# Altium footprint library 集大电协1.5.PcbLib: 227 footprints (part 9 of 18) (continued)
## LOGO_Wheel [mm] (continued)
0.277,-1.76 ; 0.241,0.267 0.419,0.267 ; 0.277,-0.409 0.472,-0.409 ; 0.295,-0.231 0.437,-0.231 ; 0.312,0.427 0.49,0.427 ; 0.312,1.316 0.668,1.316 ; 0.33,-1.689 0.721,-1.689 ; 0.33,-0.213 0.455,-0.213 ; 0.33,0.249 0.437,0.249 ; 0.348,-0.605 0.419,-0.605 ; 0.348,-0.587 0.419,-0.587 ; 0.348,-0.569 0.472,-0.569 ; 0.348,-0.551 0.508,-0.551 ; 0.348,-0.533 0.597,-0.533 ; 0.348,-0.391 0.508,-0.391 ; 0.348,0.231 0.455,0.231 ; 0.366,-1.049 0.437,-1.049 ; 0.366,-1.031 0.437,-1.031 ; 0.366,-1.013 0.437,-1.013 ; 0.366,-0.996 0.437,-0.996 ; 0.366,-0.978 0.437,-0.978 ; 0.366,-0.96 0.437,-0.96 ; 0.366,-0.942 0.437,-0.942 ; 0.366,-0.925 0.437,-0.925 ; 0.366,-0.907 0.437,-0.907 ; 0.366,-0.889 0.437,-0.889 ; 0.366,-0.871 0.437,-0.871 ; 0.366,-0.853 0.437,-0.853 ; 0.366,-0.836 0.437,-0.836 ; 0.366,-0.818 0.437,-0.818 ; 0.366,-0.8 0.437,-0.8 ; 0.366,-0.782 0.437,-0.782 ; 0.366,-0.765 0.437,-0.765 ; 0.366,-0.747 0.437,-0.747 ; 0.366,-0.729 0.437,-0.729 ; 0.366,-0.711 0.437,-0.711 ; 0.366,-0.693 0.437,-0.693 ; 0.366,-0.676 0.419,-0.676 ; 0.366,-0.658 0.419,-0.658 ; 0.366,-0.64 0.419,-0.64 ; 0.366,-0.622 0.419,-0.622 ; 0.366,-0.196 0.472,-0.196 ; 0.366,0.409 0.508,0.409 ; 0.366,0.551 0.597,0.551 ; 0.366,0.569 0.615,0.569 ; 0.366,0.587 0.49,0.587 ; 0.366,0.605 0.437,0.605 ; 0.366,0.622 0.437,0.622 ; 0.366,0.64 0.437,0.64 ; 0.366,0.658 0.437,0.658 ; 0.366,0.676 0.437,0.676 ; 0.366,0.693 0.437,0.693 ; 0.366,0.711 0.437,0.711 ; 0.366,0.729 0.437,0.729 ; 0.366,0.747 0.437,0.747 ; 0.366,0.765 0.437,0.765 ; 0.366,0.782 0.437,0.782 ; 0.366,0.8 0.437,0.8 ; 0.366,0.818 0.437,0.818 ; 0.366,0.836 0.437,0.836 ; 0.366,0.853 0.437,0.853 ; 0.366,0.871 0.437,0.871 ; 0.366,0.889 0.437,0.889 ; 0.366,0.907 0.437,0.907 ; 0.366,0.925 0.437,0.925 ; 0.366,0.942 0.437,0.942 ; 0.366,0.96 0.437,0.96 ; 0.366,0.978 0.437,0.978 ; 0.366,0.996 0.437,0.996 ; 0.366,1.013 0.437,1.013 ; 0.366,1.031 0.437,1.031 ; 0.366,1.049 0.437,1.049 ; 0.366,1.067 0.437,1.067 ; 0.366,1.085 0.437,1.085 ; 0.366,1.102 0.437,1.102 ; 0.366,1.12 0.437,1.12 ; 0.366,1.138 0.686,1.138 ; 0.366,1.156 0.632,1.156 ; 0.366,1.173 0.544,1.173 ; 0.366,1.191 0.384,1.191 ; 0.384,-1.156 0.579,-1.156 ; 0.384,-1.138 0.632,-1.138 ; 0.384,-1.12 0.686,-1.12 ; 0.384,-1.102 0.455,-1.102 ; 0.384,-1.085 0.437,-1.085 ; 0.384,-1.067 0.437,-1.067 ; 0.384,-0.178 0.49,-0.178 ; 0.384,0.213 0.472,0.213 ; 0.401,-1.28 0.686,-1.28 ; 0.401,-0.516 0.579,-0.516 ; 0.401,-0.373 0.526,-0.373 ; 0.401,-0.16 0.49,-0.16 ; 0.401,0.196 0.49,0.196 ; 0.401,0.391 0.544,0.391 ; 0.419,-1.173 0.455,-1.173 ; 0.419,-0.142 0.508,-0.142 ; 0.419,0.178 0.49,0.178 ; 0.419,1.707 0.739,1.707 ; 0.437,-0.356 0.544,-0.356 ; 0.437,-0.124 0.508,-0.124 ; 0.437,-0.107 0.526,-0.107 ; 0.437,0.142 0.508,0.142 ; 0.437,0.16 0.508,0.16 ; 0.437,0.373 0.561,0.373 ; 0.437,0.533 0.579,0.533 ; 0.455,-0.498 0.561,-0.498 ; 0.455,-0.338 0.561,-0.338 ; 0.455,-0.089 0.526,-0.089 ; 0.455,-0.071 0.526,-0.071 ; 0.455,0.089 0.526,0.089 ; 0.455,0.107 0.526,0.107 ; 0.455,0.124 0.526,0.124 ; 0.455,1.12 0.739,1.12 ; 0.472,-1.102 0.721,-1.102 ; 0.472,-0.32 0.579,-0.32 ; 0.472,-0.053 0.544,-0.053 ; 0.472,-0.036 0.544,-0.036 ; 0.472,-0.018 0.544,-0.018 ; 0.472,0 0.544,0 ; 0.472,0.018 0.544,0.018 ; 0.472,0.036 0.544,0.036 ; 0.472,0.053 0.544,0.053 ; 0.472,0.071 0.544,0.071 ; 0.472,0.356 0.579,0.356 ; 0.472,0.516 0.561,0.516 ; 0.472,1.298 0.721,1.298 ; 0.49,-1.671 0.775,-1.671 ; 0.49,-0.48 0.544,-0.48 ; 0.49,0.338 0.597,0.338 ; 0.49,0.498 0.544,0.498 ; 0.508,-1.262 0.739,-1.262 ; 0.508,-0.462 0.526,-0.462 ; 0.508,-0.302 0.597,-0.302 ; 0.508,0.32 0.597,0.32 ; 0.508,0.48 0.526,0.48 ; 0.526,-0.551 0.615,-0.551 ; 0.526,-0.284 0.615,-0.284 ; 0.526,0.302 0.615,0.302 ; 0.526,1.689 0.792,1.689 ; 0.544,-0.569 0.632,-0.569 ; 0.544,-0.267 0.632,-0.267 ; 0.544,0.284 0.632,0.284 ; 0.544,0.587 0.632,0.587 ; 0.544,1.28 0.757,1.28 ; 0.561,-0.587 0.65,-0.587 ; 0.561,-0.249 0.632,-0.249 ; 0.561,-0.231 0.65,-0.231 ; 0.561,0.267 0.632,0.267 ; 0.561,0.605 0.65,0.605 ; 0.561,1.102 0.775,1.102 ; 0.579,-1.654 0.828,-1.654 ; 0.579,-1.245 0.775,-1.245 ; 0.579,-1.085 0.757,-1.085 ; 0.579,-0.605 0.686,-0.605 ; 0.579,-0.213 0.65,-0.213 ; 0.579,-0.196 0.668,-0.196 ; 0.579,0.231 0.668,0.231 ; 0.579,0.249 0.65,0.249 ; 0.579,0.622 0.668,0.622 ; 0.597,-0.622 0.704,-0.622 ; 0.597,-0.178 0.668,-0.178 ; 0.597,-0.16 0.686,-0.16 ; 0.597,0.196 0.668,0.196 ; 0.597,0.213 0.668,0.213 ; 0.597,0.64 0.686,0.64 ; 0.615,-0.64 0.721,-0.64 ; 0.615,-0.142 0.686,-0.142 ; 0.615,-0.124 0.686,-0.124 ; 0.615,0.142 0.686,0.142 ; 0.615,0.16 0.686,0.16 ; 0.615,0.178 0.686,0.178 ; 0.615,0.658 0.704,0.658 ; 0.615,1.262 0.792,1.262 ; 0.615,1.671 0.846,1.671 ; 0.632,-1.227 0.828,-1.227 ; 0.632,-1.067 0.775,-1.067 ; 0.632,-0.658 0.739,-0.658 ; 0.632,-0.107 0.704,-0.107 ; 0.632,-0.089 0.704,-0.089 ; 0.632,-0.071 0.704,-0.071 ; 0.632,-0.053 0.704,-0.053 ; 0.632,-0.036 0.704,-0.036 ; 0.632,0.053 0.704,0.053 ; 0.632,0.071 0.704,0.071 ; 0.632,0.089 0.704,0.089 ; 0.632,0.107 0.704,0.107 ; 0.632,0.124 0.704,0.124 ; 0.632,0.676 0.721,0.676 ; 0.65,-1.636 0.864,-1.636 ; 0.65,-0.676 0.757,-0.676 ; 0.65,-0.018 0.704,-0.018 ; 0.65,0 0.704,0 ; 0.65,0.018 0.704,0.018 ; 0.65,0.036 0.704,0.036 ; 0.65,0.693 0.739,0.693 ; 0.65,1.085 0.81,1.085 ; 0.668,-1.049 0.81,-1.049 ; 0.668,-0.693 0.775,-0.693 ; 0.668,0.711 0.757,0.711 ; 0.668,1.245 0.828,1.245 ; 0.686,-1.209 0.864,-1.209 ; 0.686,-0.711 0.792,-0.711 ; 0.686,-0.284 0.792,-0.284 ; 0.686,-0.267 0.792,-0.267 ; 0.686,0.729 0.775,0.729 ; 0.686,1.067 0.828,1.067 ; 0.686,1.654 0.899,1.654 ; 0.704,-1.031 0.828,-1.031 ; 0.704,-0.729 0.81,-0.729 ; 0.704,-0.249 0.792,-0.249 ; 0.704,0.284 0.792,0.284 ; 0.704,0.302 0.792,0.302 ; 0.704,0.32 0.81,0.32 ; 0.704,0.747 0.792,0.747 ; 0.704,1.227 0.881,1.227 ; 0.721,-1.618 0.917,-1.618 ; 0.721,-0.747 0.828,-0.747 ; 0.721,-0.302 0.81,-0.302 ; 0.721,-0.231 0.81,-0.231 ; 0.721,0.249 0.81,0.249 ; 0.721,0.267 0.792,0.267 ; 0.721,0.338 0.828,0.338 ; 0.721,0.765 0.81,0.765 ; 0.739,-1.191 0.881,-1.191 ; 0.739,-1.013 0.864,-1.013 ; 0.739,-0.32 0.828,-0.32 ; 0.739,-0.213 0.81,-0.213 ; 0.739,-0.196 0.81,-0.196 ; 0.739,0.213 0.81,0.213 ; 0.739,0.231 0.81,0.231 ; 0.739,0.356 0.846,0.356 ; 0.739,0.782 0.828,0.782 ; 0.739,1.049 0.864,1.049 ; 0.739,1.636 0.935,1.636 ; 0.757,-0.996 0.881,-0.996 ; 0.757,-0.765 0.846,-0.765 ; 0.757,-0.338 0.846,-0.338 ; 0.757,-0.178 1.237,-0.178 ; 0.757,-0.16 1.397,-0.16 ; 0.757,-0.142 1.397,-0.142 ; 0.757,-0.124 1.397,-0.124 ; 0.757,0.142 1.006,0.142 ; 0.757,0.16 1.415,0.16 ; 0.757,0.178 1.415,0.178 ; 0.757,0.196 1.415,0.196 ; 0.757,0.373 0.864,0.373 ; 0.757,0.8 0.846,0.8 ; 0.757,1.209 0.899,1.209 ; 0.775,-1.6 0.953,-1.6 ; 0.775,-1.173 0.917,-1.173 ; 0.775,-0.782 0.864,-0.782 ; 0.775,-0.356 0.864,-0.356 ; 0.775,0.391 0.881,0.391 ; 0.775,0.818 0.864,0.818 ; 0.775,1.031 0.881,1.031 ; 0.792,-0.978 0.899,-0.978 ; 0.792,-0.8 0.881,-0.8 ; 0.792,-0.373 0.881,-0.373 ; 0.792,0.409 0.899,0.409 ; 0.792,0.836 0.881,0.836 ; 0.792,1.013 0.899,1.013 ; 0.792,1.191 0.935,1.191 ; 0.792,1.618 0.97,1.618 ; 0.81,-1.156 0.953,-1.156 ; 0.81,-0.96 0.917,-0.96 ; 0.81,-0.818 0.917,-0.818 ; 0.81,-0.391 0.899,-0.391 ; 0.81,0.427 0.917,0.427 ; 0.81,0.853 0.899,0.853 ; 0.828,-1.582 0.988,-1.582 ; 0.828,-0.942 0.935,-0.942 ; 0.828,-0.836 0.935,-0.836 ; 0.828,-0.409 0.917,-0.409 ; 0.828,0.445 0.935,0.445 ; 0.828,0.871 0.917,0.871 ; 0.828,0.996 0.935,0.996 ; 0.828,1.173 0.953,1.173 ; 0.846,-1.138 0.97,-1.138 ; 0.846,-0.925 0.953,-0.925 ; 0.846,-0.853 0.953,-0.853 ; 0.846,-0.427 0.935,-0.427 ; 0.846,0.462 0.935,0.462 ; 0.846,0.889 0.935,0.889 ; 0.846,0.978 0.935,0.978 ; 0.846,1.156 0.988,1.156 ; 0.846,1.6 1.006,1.6 ; 0.864,-1.565 1.024,-1.565 ; 0.864,-1.12 1.006,-1.12 ; 0.864,-0.871 0.97,-0.871 ; 0.864,-0.445 0.97,-0.445 ; 0.864,0.48 0.953,0.48 ; 0.864,0.907 0.953,0.907 ; 0.864,0.96 0.953,0.96 ; 0.881,-0.907 0.97,-0.907 ; 0.881,-0.889 0.988,-0.889 ; 0.881,-0.462 0.988,-0.462 ; 0.881,0.498 0.97,0.498 ; 0.881,0.925 0.97,0.925 ; 0.881,0.942 0.97,0.942 ; 0.881,1.138 1.006,1.138 ; 0.881,1.582 1.041,1.582 ; 0.899,-1.547 1.059,-1.547 ; 0.899,-1.102 1.024,-1.102 ; 0.899,-0.48 1.006,-0.48 ; 0.899,0.516 0.988,0.516 ; 0.917,-0.498 1.024,-0.498 ; 0.917,0.533 1.006,0.533 ; 0.917,1.12 1.041,1.12 ; 0.917,1.565 1.077,1.565 ; 0.935,-1.529 1.095,-1.529 ; 0.935,-1.085 1.059,-1.085 ; 0.935,-0.516 1.041,-0.516 ; 0.935,0.551 1.024,0.551 ; 0.953,-1.067 1.077,-1.067 ; 0.953,-0.533 1.059,-0.533 ; 0.953,0.569 1.041,0.569 ; 0.953,1.102 1.059,1.102 ; 0.97,-0.551 1.077,-0.551 ; 0.97,0.587 1.059,0.587 ; 0.97,1.085 1.077,1.085 ; 0.97,1.547 1.113,1.547 ; 0.988,-1.511 1.13,-1.511 ; 0.988,-1.049 1.095,-1.049 ; 0.988,-0.569 1.095,-0.569 ; 0.988,0.605 1.077,0.605 ; 0.988,1.067 1.113,1.067 ; 1.006,-1.031 1.113,-1.031 ; 1.006,-0.587 1.113,-0.587 ; 1.006,0.622 1.095,0.622 ; 1.006,1.529 1.13,1.529 ; 1.024,-1.494 1.148,-1.494 ; 1.024,-1.013 1.148,-1.013 ; 1.024,-0.605 1.13,-0.605 ; 1.024,0.64 1.113,0.64 ; 1.024,1.049 1.13,1.049 ; 1.041,-1.476 1.184,-1.476 ; 1.041,-0.622 1.148,-0.622 ; 1.041,0.658 1.13,0.658 ; 1.041,1.031 1.148,1.031 ; 1.041,1.511 1.166,1.511 ; 1.059,-0.996 1.166,-0.996 ; 1.059,-0.64 1.255,-0.64 ; 1.059,0.213 1.415,0.213 ; 1.059,0.676 1.219,0.676 ; 1.059,0.693 1.201,0.693 ; 1.059,1.013 1.166,1.013 ; 1.059,1.494 1.201,1.494 ; 1.077,-1.458 1.201,-1.458 ; 1.077,-0.978 1.184,-0.978 ; 1.077,-0.658 1.237,-0.658 ; 1.077,0.711 1.184,0.711 ; 1.077,0.996 1.184,0.996 ; 1.095,-0.96 1.201,-0.96 ; 1.095,-0.676 1.219,-0.676 ; 1.095,0.729 1.166,0.729 ; 1.095,0.978 1.201,0.978 ; 1.095,1.476 1.219,1.476 ; 1.113,-1.44 1.237,-1.44 ; 1.113,-0.942 1.201,-0.942 ; 1.113,0.747 1.166,0.747 ; 1.13,-1.422 1.255,-1.422 ; 1.13,-0.925 1.219,-0.925 ; 1.13,-0.693 1.201,-0.693 ; 1.13,0.96 1.219,0.96 ; 1.13,1.458 1.255,1.458 ; 1.148,-0.907 1.237,-0.907 ; 1.148,-0.711 1.184,-0.711 ; 1.148,0.658 1.237,0.658 ; 1.148,0.942 1.237,0.942 ; 1.148,1.44 1.273,1.44 ; 1.166,-1.405 1.29,-1.405 ; 1.166,-0.889 1.255,-0.889 ; 1.166,-0.622 1.255,-0.622 ; 1.166,0.64 1.255,0.64 ; 1.166,0.907 1.273,0.907 ; 1.166,0.925 1.255,0.925 ; 1.184,-1.387 1.308,-1.387 ; 1.184,-0.871 1.273,-0.871 ; 1.184,-0.605 1.273,-0.605 ; 1.184,0.605 1.273,0.605 ; 1.184,0.622 1.255,0.622 ; 1.184,0.889 1.29,0.889 ; 1.184,1.422 1.29,1.422 ; 1.201,-0.853 1.29,-0.853 ; 1.201,-0.587 1.29,-0.587 ; 1.201,0.587 1.29,0.587 ; 1.201,0.871 1.29,0.871 ; 1.201,1.405 1.326,1.405 ; 1.219,-1.369 1.326,-1.369 ; 1.219,-0.836 1.308,-0.836 ; 1.219,-0.569 1.29,-0.569 ; 1.219,-0.551 1.308,-0.551 ; 1.219,0.569 1.29,0.569 ; 1.219,0.853 1.308,0.853 ; 1.237,-1.351 1.344,-1.351 ; 1.237,-0.818 1.308,-0.818 ; 1.237,-0.8 1.326,-0.8 ; 1.237,-0.533 1.326,-0.533 ; 1.237,0.533 1.326,0.533 ; 1.237,0.551 1.308,0.551 ; 1.237,0.836 1.326,0.836 ; 1.237,1.387 1.344,1.387 ; 1.255,-1.333 1.379,-1.333 ; 1.255,-0.782 1.344,-0.782 ; 1.255,-0.516 1.326,-0.516 ; 1.255,-0.498 1.326,-0.498 ; 1.255,0.498 1.344,0.498 ; 1.255,0.516 1.326,0.516 ; 1.255,0.8 1.344,0.8 ; 1.255,0.818 1.344,0.818 ; 1.255,1.369 1.361,1.369 ; 1.273,-0.765 1.361,-0.765 ; 1.273,-0.48 1.344,-0.48 ; 1.273,-0.462 1.344,-0.462 ; 1.273,-0.445 1.361,-0.445 ; 1.273,-0.107 1.397,-0.107 ; 1.273,0.462 1.361,0.462 ; 1.273,0.48 1.344,0.48 ; 1.273,0.782 1.361,0.782 ; 1.273,1.351 1.379,1.351 ; 1.29,-1.316 1.397,-1.316 ; 1.29,-0.747 1.361,-0.747 ; 1.29,-0.729 1.379,-0.729 ; 1.29,-0.427 1.361,-0.427 ; 1.29,-0.409 1.361,-0.409 ; 1.29,-0.391 1.361,-0.391 ; 1.29,0.427 1.379,0.427 ; 1.29,0.445 1.361,0.445 ; 1.29,0.765 1.379,0.765 ; 1.29,1.333 1.397,1.333 ; 1.308,-1.298 1.415,-1.298 ; 1.308,-0.711 1.397,-0.711 ; 1.308,-0.373 1.379,-0.373 ; 1.308,-0.356 1.379,-0.356 ; 1.308,-0.338 1.379,-0.338 ; 1.308,-0.32 1.379,-0.32 ; 1.308,0.391 1.379,0.391 ; 1.308,0.409 1.379,0.409 ; 1.308,0.729 1.397,0.729 ; 1.308,0.747 1.379,0.747 ; 1.308,1.316 1.415,1.316 ; 1.326,-1.28 1.433,-1.28 ; 1.326,-0.693 1.397,-0.693 ; 1.326,-0.676 1.415,-0.676 ; 1.326,-0.302 1.379,-0.302 ; 1.326,-0.284 1.397,-0.284 ; 1.326,-0.267 1.397,-0.267 ; 1.326,-0.249 1.397,-0.249 ; 1.326,-0.231 1.397,-0.231 ; 1.326,-0.213 1.397,-0.213 ; 1.326,-0.196 1.397,-0.196 ; 1.326,-0.178 1.397,-0.178 ; 1.326,0.302 1.397,0.302 ; 1.326,0.32 1.397,0.32 ; 1.326,0.338 1.397,0.338 ; 1.326,0.356 1.397,0.356 ; 1.326,0.373 1.397,0.373 ; 1.326,0.711 1.415,0.711 ; 1.344,-1.262 1.45,-1.262 ; 1.344,-0.658 1.415,-0.658 ; 1.344,-0.64 1.433,-0.64 ; 1.344,0.231 1.415,0.231 ; 1.344,0.249 1.415,0.249 ; 1.344,0.267 1.415,0.267 ; 1.344,0.284 1.397,0.284 ; 1.344,0.676 1.433,0.676 ; 1.344,0.693 1.415,0.693 ; 1.344,1.298 1.433,1.298 ; 1.361,-1.245 1.468,-1.245 ; 1.361,-0.622 1.45,-0.622 ; 1.361,0.64 1.45,0.64 ; 1.361,0.658 1.433,0.658 ; 1.361,1.28 1.45,1.28 ; 1.379,-1.227 1.486,-1.227 ; 1.379,-0.605 1.45,-0.605 ; 1.379,-0.587 1.468,-0.587 ; 1.379,0.605 1.468,0.605 ; 1.379,0.622 1.45,0.622 ; 1.379,1.262 1.486,1.262 ; 1.397,-0.569 1.468,-0.569 ; 1.397,-0.551 1.468,-0.551 ; 1.397,0.569 1.486,0.569 ; 1.397,0.587 1.468,0.587 ; 1.397,1.245 1.486,1.245 ; 1.415,-1.209 1.504,-1.209 ; 1.415,-0.533 1.486,-0.533 ; 1.415,-0.516 1.486,-0.516 ; 1.415,0.533 1.486,0.533 ; 1.415,0.551 1.486,0.551 ; 1.415,1.227 1.504,1.227 ; 1.433,-1.191 1.521,-1.191 ; 1.433,-0.498 1.504,-0.498 ; 1.433,-0.48 1.504,-0.48 ; 1.433,-0.462 1.521,-0.462 ; 1.433,0.48 1.521,0.48 ; 1.433,0.498 1.504,0.498 ; 1.433,0.516 1.504,0.516 ; 1.433,1.209 1.521,1.209 ; 1.45,-1.173 1.539,-1.173 ; 1.45,-1.156 1.557,-1.156 ; 1.45,-0.445 1.521,-0.445 ; 1.45,-0.427 1.521,-0.427 ; 1.45,-0.409 1.539,-0.409 ; 1.45,0.445 1.521,0.445 ; 1.45,0.462 1.521,0.462 ; 1.45,1.191 1.539,1.191 ; 1.468,-1.138 1.575,-1.138 ; 1.468,-0.391 1.539,-0.391 ; 1.468,-0.373 1.539,-0.373 ; 1.468,-0.356 1.539,-0.356 ; 1.468,0.391 1.539,0.391 ; 1.468,0.409 1.539,0.409 ; 1.468,0.427 1.539,0.427 ; 1.468,1.173 1.557,1.173 ; 1.486,-1.12 1.593,-1.12 ; 1.486,-0.338 1.557,-0.338 ; 1.486,-0.32 1.557,-0.32 ; 1.486,-0.302 1.557,-0.302 ; 1.486,-0.284 1.557,-0.284 ; 1.486,0.32 1.557,0.32 ; 1.486,0.338 1.557,0.338 ; 1.486,0.356 1.557,0.356 ; 1.486,0.373 1.539,0.373 ; 1.486,1.156 1.575,1.156 ; 1.504,-1.102 1.593,-1.102 ; 1.504,-0.267 1.575,-0.267 ; 1.504,-0.249 1.575,-0.249 ; 1.504,-0.231 1.575,-0.231 ; 1.504,-0.213 1.575,-0.213 ; 1.504,-0.196 1.575,-0.196 ; 1.504,0.213 1.575,0.213 ; 1.504,0.231 1.575,0.231 ; 1.504,0.249 1.575,0.249 ; 1.504,0.267 1.575,0.267 ; 1.504,0.284 1.575,0.284 ; 1.504,0.302 1.575,0.302 ; 1.504,1.138 1.593,1.138 ; 1.521,-1.085 1.61,-1.085 ; 1.521,-0.178 1.593,-0.178 ; 1.521,-0.16 1.593,-0.16 ; 1.521,-0.142 1.593,-0.142 ; 1.521,-0.124 1.593,-0.124 ; 1.521,-0.107 1.593,-0.107 ; 1.521,-0.089 1.593,-0.089 ; 1.521,-0.071 1.593,-0.071 ; 1.521,-0.053 1.593,-0.053 ; 1.521,-0.036 1.593,-0.036 ; 1.521,-0.018 1.593,-0.018 ; 1.521,0 1.593,0 ; 1.521,0.018 1.593,0.018 ; 1.521,0.036 1.593,0.036 ; 1.521,0.053 1.593,0.053 ; 1.521,0.071 1.593,0.071 ; 1.521,0.089 1.593,0.089 ; 1.521,0.107 1.593,0.107 ; 1.521,0.124 1.593,0.124 ; 1.521,0.142 1.593,0.142 ; 1.521,0.16 1.593,0.16 ; 1.521,0.178 1.593,0.178 ; 1.521,0.196 1.593,0.196 ; 1.521,1.12 1.61,1.12 ; 1.539,-1.067 1.628,-1.067 ; 1.539,1.085 1.628,1.085 ; 1.539,1.102 1.61,1.102 ; 1.557,-1.049 1.646,-1.049 ; 1.557,-1.031 1.646,-1.031 ; 1.557,1.067 1.646,1.067 ; 1.575,-1.013 1.664,-1.013 ; 1.575,1.049 1.664,1.049 ; 1.593,-0.996 1.681,-0.996 ; 1.593,1.013 1.681,1.013 ; 1.593,1.031 1.664,1.031 ; 1.61,-0.978 1.681,-0.978 ; 1.61,-0.96 1.699,-0.96 ; 1.61,0.996 1.699,0.996 ; 1.628,-0.942 1.717,-0.942 ; 1.628,0.978 1.699,0.978 ; 1.646,-0.925 1.717,-0.925 ; 1.646,-0.907 1.735,-0.907 ; 1.646,0.942 1.735,0.942 ; 1.646,0.96 1.717,0.96 ; 1.664,-0.889 1.753,-0.889 ; 1.664,0.907 1.753,0.907 ; 1.664,0.925 1.735,0.925 ; 1.681,-0.871 1.753,-0.871 ; 1.681,-0.853 1.77,-0.853 ; 1.681,0.889 1.77,0.889 ; 1.699,-0.836 1.77,-0.836 ; 1.699,-0.818 1.788,-0.818 ; 1.699,0.853 1.788,0.853 ; 1.699,0.871 1.77,0.871 ; 1.717,-0.8 1.788,-0.8 ; 1.717,0.818 1.806,0.818 ; 1.717,0.836 1.788,0.836 ; 1.735,-0.782 1.806,-0.782 ; 1.735,-0.765 1.806,-0.765 ; 1.735,0.782 1.824,0.782 ; 1.735,0.8 1.806,0.8 ; 1.753,-0.747 1.824,-0.747 ; 1.753,-0.729 1.824,-0.729 ; 1.753,0.747 1.841,0.747 ; 1.753,0.765 1.824,0.765 ; 1.77,-0.711 1.841,-0.711 ; 1.77,-0.693 1.841,-0.693 ; 1.77,0.711 1.841,0.711 ; 1.77,0.729 1.841,0.729 ; 1.788,-0.676 1.859,-0.676 ; 1.788,-0.658 1.859,-0.658 ; 1.788,-0.64 1.859,-0.64 ; 1.788,0.676 1.859,0.676 ; 1.788,0.693 1.859,0.693 ; 1.806,-0.622 1.877,-0.622 ; 1.806,-0.605 1.877,-0.605 ; 1.806,0.622 1.877,0.622 ; 1.806,0.64 1.877,0.64 ; 1.806,0.658 1.877,0.658 ; 1.824,-0.587 1.895,-0.587 ; 1.824,-0.569 1.895,-0.569 ; 1.824,-0.551 1.895,-0.551 ; 1.824,0.569 1.895,0.569 ; 1.824,0.587 1.895,0.587 ; 1.824,0.605 1.895,0.605 ; 1.841,-0.533 1.913,-0.533 ; 1.841,-0.516 1.913,-0.516 ; 1.841,-0.498 1.913,-0.498 ; 1.841,0.516 1.913,0.516 ; 1.841,0.533 1.913,0.533 ; 1.841,0.551 1.913,0.551 ; 1.859,-0.48 1.93,-0.48 ; 1.859,-0.462 1.93,-0.462 ; 1.859,-0.445 1.93,-0.445 ; 1.859,-0.427 1.93,-0.427 ; 1.859,0.462 1.93,0.462 ; 1.859,0.48 1.93,0.48 ; 1.859,0.498 1.93,0.498 ; 1.877,-0.409 1.948,-0.409 ; 1.877,-0.391 1.948,-0.391 ; 1.877,-0.373 1.948,-0.373 ; 1.877,-0.356 1.948,-0.356 ; 1.877,0.391 1.948,0.391 ; 1.877,0.409 1.948,0.409 ; 1.877,0.427 1.948,0.427 ; 1.877,0.445 1.948,0.445 ; 1.895,-0.338 1.966,-0.338 ; 1.895,-0.32 1.966,-0.32 ; 1.895,-0.302 1.966,-0.302 ; 1.895,-0.284 1.966,-0.284 ; 1.895,-0.267 1.966,-0.267 ; 1.895,0.284 1.966,0.284 ; 1.895,0.302 1.966,0.302 ; 1.895,0.32 1.966,0.32 ; 1.895,0.338 1.966,0.338 ; 1.895,0.356 1.966,0.356 ; 1.895,0.373 1.948,0.373 ; 1.913,-0.249 1.966,-0.249 ; 1.913,-0.231 1.984,-0.231 ; 1.913,-0.213 1.984,-0.213 ; 1.913,-0.196 1.984,-0.196 ; 1.913,-0.178 1.984,-0.178 ; 1.913,-0.16 1.984,-0.16 ; 1.913,-0.142 1.984,-0.142 ; 1.913,-0.124 1.984,-0.124 ; 1.913,-0.107 1.984,-0.107 ; 1.913,0.142 1.984,0.142 ; 1.913,0.16 1.984,0.16 ; 1.913,0.178 1.984,0.178 ; 1.913,0.196 1.984,0.196 ; 1.913,0.213 1.984,0.213 ; 1.913,0.231 1.984,0.231 ; 1.913,0.249 1.984,0.249 ; 1.913,0.267 1.984,0.267 ; 1.93,-0.089 1.984,-0.089 ; 1.93,-0.071 1.984,-0.071 ; 1.93,-0.053 1.984,-0.053 ; 1.93,-0.036 1.984,-0.036 ; 1.93,-0.018 2.002,-0.018 ; 1.93,0 2.002,0 ; 1.93,0.018 2.002,0.018 ; 1.93,0.036 2.002,0.036 ; 1.93,0.053 1.984,0.053 ; 1.93,0.071 1.984,0.071 ; 1.93,0.089 1.984,0.089 ; 1.93,0.107 1.984,0.107 ; 1.93,0.124 1.984,0.124